# Altium footprint library pcb.PcbLib: 20 footprints (part 2 of 2)
Each footprint in its own frame and in the unit in brackets; x right, y up, seen from the top. Pads: shape width x height; smd on the part's side, far side on the other; paste and mask are expansions set on the pad; w line width, h text height; cw(c..) or ccw(c..) is an arc to the next point about the centre after c.
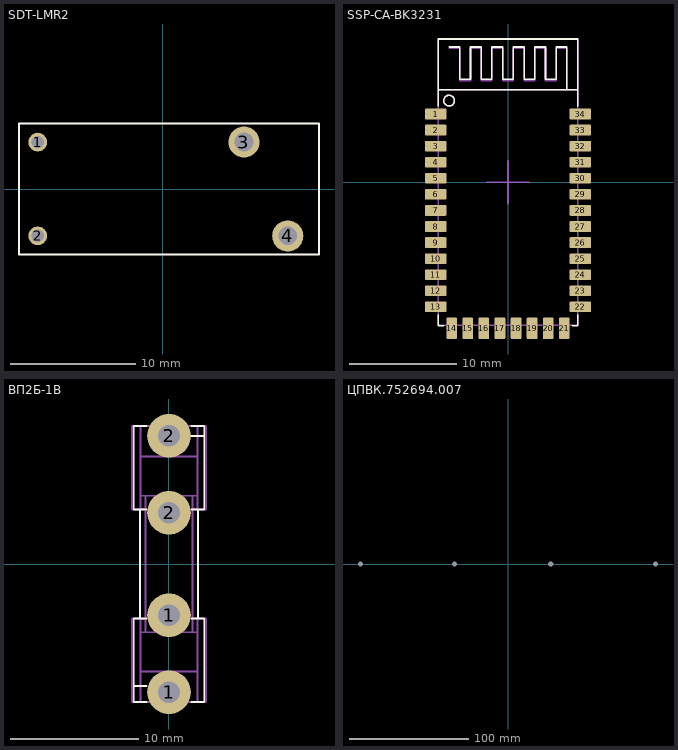
[diagram p1: the footprints below, top view; thin cyan lines are the x and y axes]

## SDT-LMR2 [mm]
height 25
pads (4):
  round 1.5 hole 1: 1(-10,3.75) 2(-10,-3.75)
  round 2.5 hole 1.5: 3(6.5,3.75) 4(10,-3.75)
Top Overlay:
  lines w0.15: -11.5,-5.25 12.5,-5.25 12.5,5.25 -11.5,5.25 -11.5,-5.25
3D body: height 25, standoff 0.5, extent -11.499,-5.249 12.499,5.249

## SSP-CA-BK3231 [mm]
height 2
pads (34):
  rrect20% 2x1 smd: 1(-6.75,6.375) 2(-6.75,4.875) 3(-6.75,3.375) 4(-6.75,1.875) 5(-6.75,0.375) 6(-6.75,-1.125) 7(-6.75,-2.625) 8(-6.75,-4.125) 9(-6.75,-5.625) 10(-6.75,-7.125) 11(-6.75,-8.625) 12(-6.75,-10.125) 13(-6.75,-11.625) 22(6.75,-11.625) 23(6.75,-10.125) 24(6.75,-8.625) 25(6.75,-7.125) 26(6.75,-5.625) 27(6.75,-4.125) 28(6.75,-2.625) 29(6.75,-1.125) 30(6.75,0.375) 31(6.75,1.875) 32(6.75,3.375) 33(6.75,4.875) 34(6.75,6.375)
  rrect20% 1x2 smd: 14(-5.25,-13.625) 15(-3.75,-13.625) 16(-2.25,-13.625) 17(-0.75,-13.625) 18(0.75,-13.625) 19(2.25,-13.625) 20(3.75,-13.625) 21(5.25,-13.625)
Top Overlay:
  circle w0.15: c-5.5,7.625 r0.5
  lines w0.15: -6.5,-12.375 -6.5,-13.375 -6,-13.375 ; -6.5,7.125 -6.5,13.375 6.5,13.375 6.5,7.125 ; -6.5,8.625 6.5,8.625 ; -5.5,12.625 -4.5,12.625 -4.5,9.625 -3.5,9.625 -3.5,12.625 -2.5,12.625 -2.5,9.625 -1.5,9.625 -1.5,12.625 -0.5,12.625 -0.5,9.625 0.5,9.625 0.5,12.625 1.5,12.625 1.5,9.625 2.5,9.625 2.5,12.625 3.5,12.625 3.5,9.625 4.5,9.625 4.5,12.625 5.5,12.625 5.5,8.625 ; 6,-13.375 6.5,-13.375 6.5,-12.375
Mechanical 15:
  lines w0.15: -2,0 0,0 2,0 ; 0,-2 0,2
Top Assembly:
  circle w0.15: c-5.5,7.625 r0.5
  lines w0.15: -6.5,8.65 6.5,8.65 ; -5.5,12.5 -4.5,12.5 -4.5,9.5 -3.5,9.5 -3.5,12.5 -2.5,12.5 -2.5,9.5 -1.5,9.5 -1.5,12.5 -0.5,12.5 -0.5,9.5 0.5,9.5 0.5,12.5 1.5,12.5 1.5,9.5 2.5,9.5 2.5,12.5 3.5,12.5 3.5,9.5 4.5,9.5 4.5,12.5 5.5,12.5 5.5,8.65 ; -6.5,-13.35 -6.5,13.375 6.5,13.375 6.5,-13.35 -6.5,-13.35
  text ".Designator" at -4,-1.3 h1

## ВП2Б-1В [mm]
pads (4):
  round 3.4 hole 1.7: 1(0,-10) 1(0,-4) 2(0,4) 2(0,10)
Top Overlay:
  lines w0.15: -2.75,-9.5 -1.75,-9.5 ; -2.25,-4.25 -2.25,4.25 ; -1.75,-10.75 -2.75,-10.75 -2.75,-4.25 -1.75,-4.25 ; -1.75,4.25 -2.75,4.25 -2.75,10.75 -1.75,10.75 ; 1.75,-10.75 2.75,-10.75 2.75,-4.25 1.75,-4.25 ; 1.75,4.25 2.75,4.25 2.75,10.75 1.75,10.75 ; 1.75,10 2.75,10 ; 2.25,-4.25 2.25,4.25
Top Assembly:
  lines w0.15: -2.225,-8.4 2.225,-8.4 2.225,-5.325 -2.225,-5.325 -2.225,-7.9 ; -2.225,5.325 2.225,5.325 ; -2.225,8.4 2.225,8.4 ; -1.825,-5.325 -1.825,5.325 1.825,5.325 1.825,-5.325 ; -1.825,-4.275 -2.225,-4.275 -2.225,-4.25 ; -1.825,4.275 -2.225,4.275 -2.225,4.25 ; 1.825,4.275 2.225,4.275 2.225,4.25 ; 1.875,-4.25 2.225,-4.25 ; -2.225,-10.75 2.225,-10.75 ; -2.225,-10.75 -2.9,-10.75 -2.9,-4.25 -2.225,-4.25 ; -2.225,-10.75 -2.225,-4.25 ; -2.225,4.25 -2.9,4.25 -2.9,10.75 -2.225,10.75 ; -2.225,4.25 -2.225,10.75 ; -2.225,10.75 2.225,10.75 ; 2.225,-10.75 2.9,-10.75 2.9,-4.25 2.225,-4.25 ; 2.225,-10.75 2.225,-4.25 ; 2.225,4.25 2.9,4.25 2.9,10.75 2.225,10.75 ; 2.225,4.25 2.225,10.75
  text ".Designator" at 0.3,-3 h1
3D body "half-fuse-holder.STEP": height 9.86, standoff -3.33, extent -3.1,4.476 3.1,10.576
3D body "half-fuse-holder.STEP": height 9.86, standoff -3.33, extent -3.1,-10.51 3.1,-4.41
3D body "User Library-FUSIVEL.STEP": height 9.5, standoff 4.5, extent -2.5,-10 2.5,10

## ЦПВК.752694.007 [mm]
pads (4):
  round 3 hole 4.3 unplated: TH(-124,0) TH(-45,0) TH(36,0) TH(124,0)
3D body "ЦПВК.752694.007 Радиатор.STEP": height 76, standoff 0, extent -129,-20.5 129,19.5